# Altium footprint library MotorDriver.PcbLib: 29 footprints (part 1 of 2)
Each footprint in its own frame and in the unit in brackets; x right, y up, seen from the top. Pads: shape width x height; smd on the part's side, far side on the other; paste and mask are expansions set on the pad; w line width, h text height; cw(c..) or ccw(c..) is an arc to the next point about the centre after c.
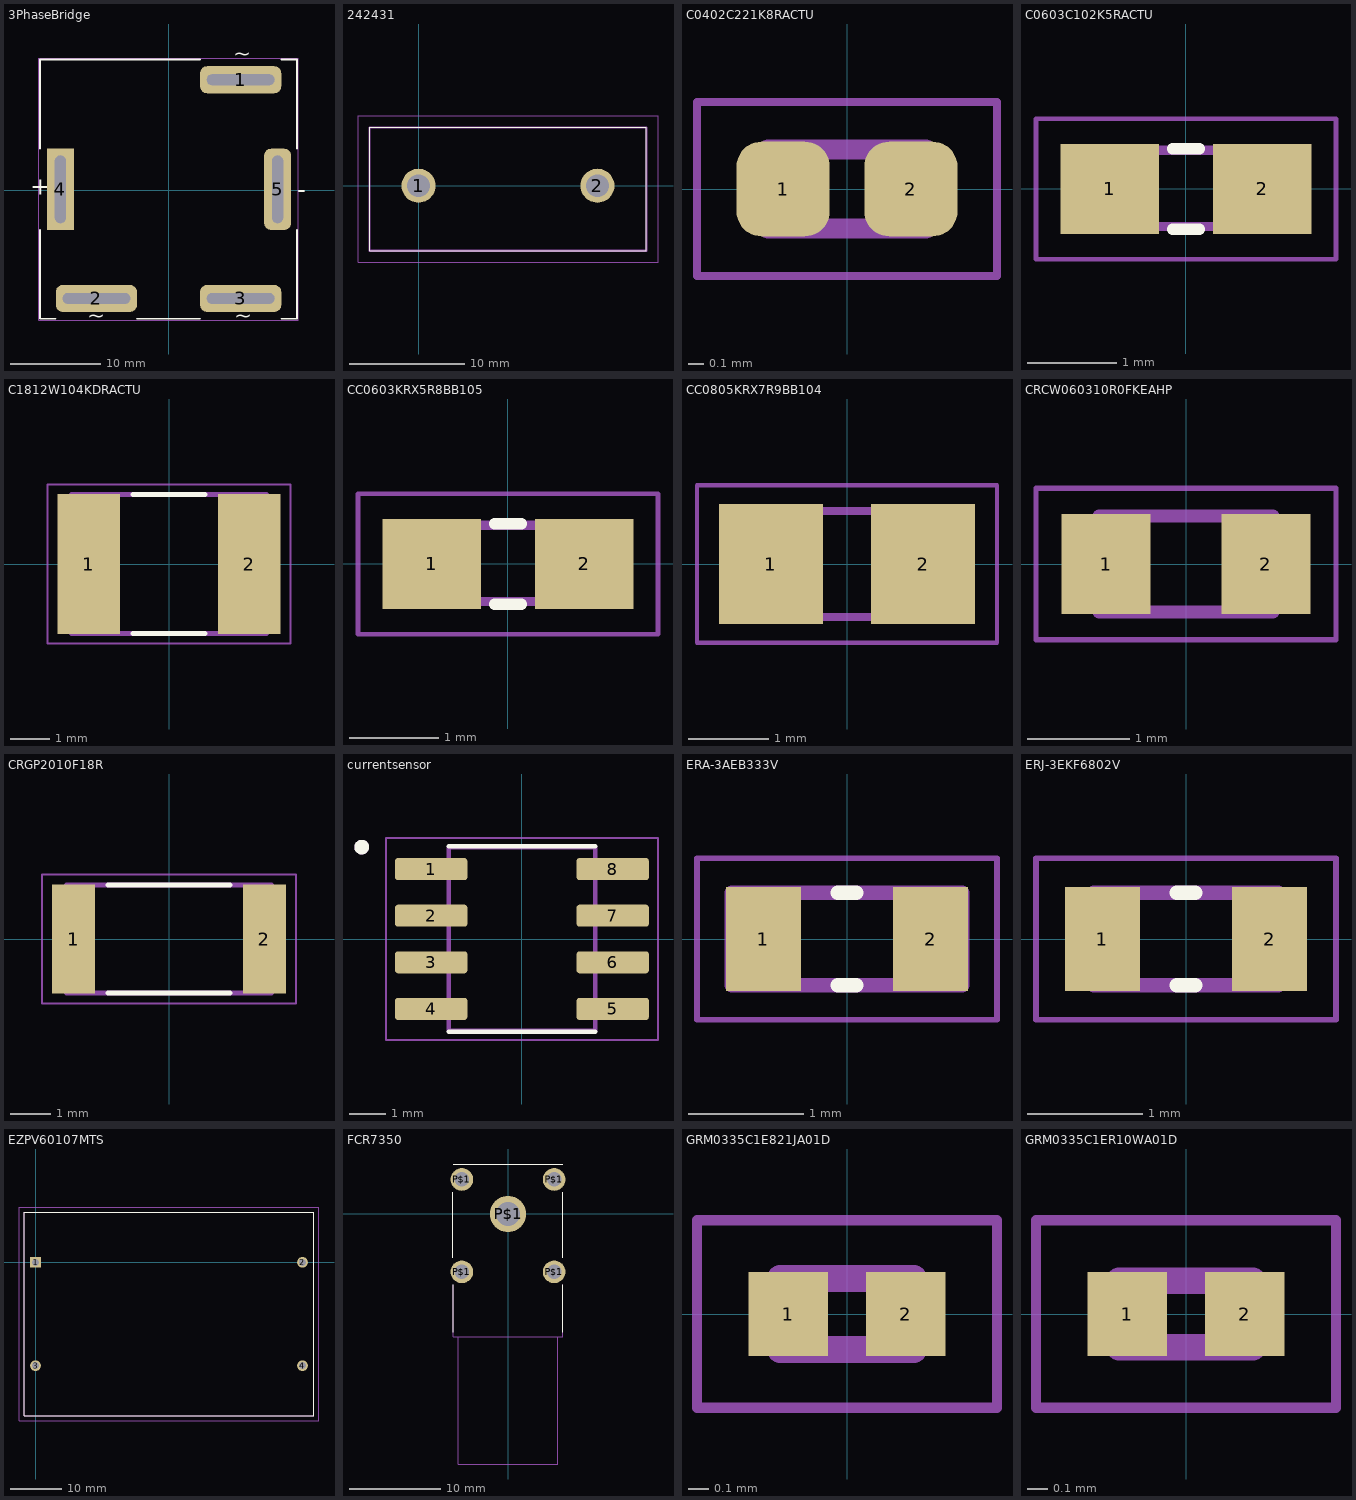
[diagram p0: the footprints below, top view; thin cyan lines are the x and y axes]

## 3PhaseBridge [mm]
pads (5):
  rrect50% 9x3 hole 1.2 slot 7.5 at 0 deg: 1(8,12.25) 2(-8,-12) 3(8,-12)
  rect 3x9 hole 7.5 slot 1.2 at 0 deg: 4(-12,0.1)
  rrect50% 3x9 hole 7.5 slot 1.2 at 0 deg: 5(12.1,0.1)
Top Overlay:
  lines w0.2: -14.25,-4.4 -14.25,-14.25 -12.5,-14.25 ; -14.25,4.6 -14.25,14.5 3.5,14.5 ; -3.5,-14.25 3.498,-14.25 ; 12.5,-14.25 14.25,-14.25 14.25,-4.4 ; 12.5,14.5 14.25,14.5 14.25,4.6
  text "+" at -15.346,-0.479 h2
  text "-" at 14.254,-0.846 h2
  text "~" at -9,-15.333 h3
  text "~" at 7.3,-15.333 h3
  text "~" at 7.2,13.767 h3
Mechanical 15:
  lines w0.1: -14.377,-14.402 14.377,-14.402 14.377,14.652 -14.377,14.652 -14.377,-14.402
3D body "p15.1_DB.stp": height 13.5, standoff -8.1, extent -14.2,-14.1 14.3,14.4

## 242431 [mm]
pads (2):
  round 2.955 hole 1.97: 1(0,0) 2(15.5,0)
Top Overlay:
  lines w0.1: -4.25,-5.65 19.75,-5.65 19.75,5.08 -4.25,5.08 -4.25,-5.65
Mechanical 13:
  lines w0.1: -5.25,-6.65 20.75,-6.65 20.75,6.08 -5.25,6.08 -5.25,-6.65
  lines w0.2: -4.25,-5.65 19.75,-5.65 19.75,5.05 -4.25,5.05 -4.25,-5.65
3D body "step_temp.STEP": height 13, standoff -6, extent -4.253,-5.685 19.747,5.015

## C0402C221K8RACTU [mm]
height 0.55
pads (2):
  rrect53% 0.59x0.6 smd: 1(-0.405,0) 2(0.405,0)
Mechanical 13:
  lines w0.127: -0.5,-0.25 0.5,-0.25 0.5,0.25 -0.5,0.25 -0.5,-0.25
Mechanical 15:
  lines w0.05: -0.95,-0.55 0.95,-0.55 0.95,0.55 -0.95,0.55 -0.95,-0.55
3D body "C0402C221K8RACTU.STEP": height 0.55, standoff 0, extent -0.489,-0.256 0.511,0.244

## C0603C102K5RACTU [mm]
pads (2):
  rect 1.1x1 smd: 1(-0.85,0) 2(0.85,0)
Top Overlay:
  lines w0.127: -0.15,-0.45 0.15,-0.45 ; -0.15,0.45 0.15,0.45
Mechanical 13:
  region: 0.83,-0.471 0.331,-0.471 0.331,0.48 0.83,0.48
  region: -0.338,-0.47 -0.839,-0.47 -0.839,0.48 -0.338,0.48
  lines w0.102: -0.356,-0.419 0.356,-0.419 ; -0.356,0.432 0.356,0.432
Mechanical 15:
  lines w0.051: -1.673,-0.783 -1.673,0.783 1.673,0.783 1.673,-0.783 -1.673,-0.783
3D body "C0603C102K5RACTU.STEP": height 0.87, standoff 0, extent -0.8,-0.4 0.8,0.4

## C1812W104KDRACTU [mm]
pads (2):
  rect 1.57x3.51 smd: 1(-2.017,0) 2(2.017,0)
Top Overlay:
  lines w0.127: -0.91,-1.75 0.91,-1.75 ; -0.91,1.75 0.91,1.75
Mechanical 13:
  lines w0.127: -2.45,-1.75 -2.45,1.75 2.45,1.75 2.45,-1.75 -2.45,-1.75
Mechanical 15:
  lines w0.05: -3.054,-2.005 -3.054,2.005 3.054,2.005 3.054,-2.005 -3.054,-2.005
3D body "C1812W104KDRACTU.STEP": height 1.85, standoff 0, extent -2.25,-1.6 2.25,1.6

## CC0603KRX5R8BB105 [mm]
pads (2):
  rect 1.1x1 smd: 1(-0.85,0) 2(0.85,0)
Top Overlay:
  lines w0.127: -0.15,-0.45 0.15,-0.45 ; -0.15,0.45 0.15,0.45
Mechanical 13:
  region: -0.338,-0.47 -0.839,-0.47 -0.839,0.48 -0.338,0.48
  region: 0.83,-0.471 0.331,-0.471 0.331,0.48 0.83,0.48
  lines w0.102: -0.356,-0.419 0.356,-0.419 ; -0.356,0.432 0.356,0.432
Mechanical 15:
  lines w0.051: -1.673,-0.783 1.673,-0.783 1.673,0.783 -1.673,0.783 -1.673,-0.783
3D body "CC0603KRX5R8BB105.STEP": height 0.9, standoff 0, extent -0.806,-0.399 0.794,0.401

## CC0805KRX7R9BB104 [mm]
pads (2):
  rect 1.3x1.5 smd: 1(-0.95,0) 2(0.95,0)
Mechanical 13:
  region: 1.106,-0.725 0.356,-0.725 0.356,0.726 1.106,0.726
  region: -0.342,-0.724 -1.093,-0.724 -1.093,0.726 -0.342,0.726
  lines w0.102: -0.381,0.66 0.381,0.66 ; -0.356,-0.66 0.381,-0.66
Mechanical 15:
  lines w0.051: -1.873,-0.983 -1.873,0.983 1.873,0.983 1.873,-0.983 -1.873,-0.983
3D body "CC0805KRX7R9BB104.STEP": height 0.7, standoff 0, extent -1,-0.625 1,0.625

## CRCW060310R0FKEAHP [mm]
pads (2):
  rect 0.87x0.98 smd: 1(-0.78,0) 2(0.78,0)
Mechanical 13:
  lines w0.127: -0.85,-0.47 -0.85,0.47 0.85,0.47 0.85,-0.47 -0.85,-0.47
Mechanical 15:
  lines w0.05: -1.465,-0.74 -1.465,0.74 1.465,0.74 1.465,-0.74 -1.465,-0.74
3D body "CRCW060310R0FKEAHP.STEP": height 0.55, standoff 0, extent -0.8,-0.425 0.8,0.425

## CRGP2010F18R [mm]
pads (2):
  rect 1.07x2.72 smd: 1(-2.38,0) 2(2.38,0)
Top Overlay:
  lines w0.127: -1.52,-1.35 1.52,-1.35 ; -1.52,1.35 1.52,1.35
Mechanical 13:
  lines w0.127: -2.55,-1.35 2.55,-1.35 2.55,1.35 -2.55,1.35 -2.55,-1.35
Mechanical 15:
  lines w0.05: -3.165,-1.608 3.165,-1.608 3.165,1.608 -3.165,1.608 -3.165,-1.608
3D body "CRGP2010F18R.STEP": height 0.65, standoff 0, extent -2.5,-1.25 2.5,1.25

## currentsensor [mm]
pads (8):
  rrect25% 1.97x0.6 smd: 1(-2.475,1.905) 2(-2.475,0.635) 3(-2.475,-0.635) 4(-2.475,-1.905) 5(2.475,-1.905) 6(2.475,-0.635) 7(2.475,0.635) 8(2.475,1.905)
Top Overlay:
  circle w0.2: c-4.37,2.505 r0.1
  lines w0.127: -2,-2.525 2,-2.525 ; -2,2.525 2,2.525
Mechanical 13:
  circle w0.2: c-4.37,2.505 r0.1
  lines w0.127: -2,-2.5 2,-2.5 2,2.5 -2,2.5 -2,-2.5
Mechanical 15:
  lines w0.05: -3.71,-2.75 3.71,-2.75 3.71,2.75 -3.71,2.75 -3.71,-2.75
3D body "step_temp.STEP": height 1.75, standoff 0, extent -3,-2.45 3,2.45

## ERA-3AEB333V [mm]
pads (2):
  rect 0.65x0.9 smd: 1(-0.725,0) 2(0.725,0)
Top Overlay:
  lines w0.127: -0.08,-0.4 0.08,-0.4 ; -0.08,0.4 0.08,0.4
Mechanical 13:
  lines w0.127: -1,-0.4 -1,0.4 1,0.4 1,-0.4 -1,-0.4
Mechanical 15:
  lines w0.05: -1.3,-0.7 -1.3,0.7 1.3,0.7 1.3,-0.7 -1.3,-0.7
3D body "ERA3AEB333V.STEP": height 0.45, standoff 0, extent -0.8,-0.4 0.8,0.4

## ERJ-3EKF6802V [mm]
pads (2):
  rect 0.65x0.9 smd: 1(-0.725,0) 2(0.725,0)
Top Overlay:
  lines w0.127: -0.08,-0.4 0.08,-0.4 ; -0.08,0.4 0.08,0.4
Mechanical 13:
  lines w0.127: -0.8,-0.4 -0.8,0.4 0.8,0.4 0.8,-0.4 -0.8,-0.4
Mechanical 15:
  lines w0.05: -1.3,-0.7 -1.3,0.7 1.3,0.7 1.3,-0.7 -1.3,-0.7
3D body "ERJ3EKF6802V.STEP": height 0.45, standoff 0, extent -0.8,-0.4 0.8,0.4

## EZPV60107MTS [mm]
pads (4):
  rect 2.1x2.1 hole 1.4: 1(0,0)
  round 2.1 hole 1.4: 2(52.5,0) 3(0,-20.3) 4(52.5,-20.3)
Top Overlay:
  lines w0.2: -2.25,-30.15 54.75,-30.15 54.75,9.85 -2.25,9.85 -2.25,-30.15
Mechanical 13:
  lines w0.1: -2.25,-30.15 54.75,-30.15 54.75,9.85 -2.25,9.85 -2.25,-30.15
Mechanical 15:
  lines w0.1: -3.25,-31.15 55.75,-31.15 55.75,10.85 -3.25,10.85 -3.25,-31.15
3D body "EZP-V60107MTS.stp": height 52.6, standoff -5, extent -2.25,-30.15 54.75,9.85

## FCR7350 [mm]
pads (5):
  round 2.5 hole 1.6: P$1(-5.08,-6.36) P$1(-5.08,3.8) P$1(5.08,-6.36) P$1(5.08,3.8)
  round 4 hole 2.6: P$1(0,0)
Top Overlay:
  lines w0.127: -6.1,-4.8 -6.1,2.4 ; -6,-13 -6,-7.8 ; -6,5.5 6,5.5 ; 6,-13 6,-7.8 ; 6,-4.8 6,2.4
Mechanical 13:
  lines w0.127: -6,-7.8 -6,-13.5 -5.5,-13.5 ; 6,-7.8 6,-13.5 5.5,-13.5 ; -5.5,-13.5 -5.5,-27.5 5.5,-27.5 5.5,-13.5 ; -5.5,-13.5 5.5,-13.5
3D body "step_temp.STEP": height 11.5, standoff -3.4, extent -5.904,-27.549 6.096,5.451

## GRM0335C1E821JA01D [mm]
pads (2):
  rect 0.38x0.4 smd: 1(-0.281,0) 2(0.281,0)
Mechanical 13:
  lines w0.127: -0.32,-0.17 -0.32,0.17 0.32,0.17 0.32,-0.17 -0.32,-0.17
Mechanical 15:
  lines w0.05: -0.718,-0.448 -0.718,0.448 0.718,0.448 0.718,-0.448 -0.718,-0.448
3D body "GRM0335C1E821JA01D.STEP": height 0.33, standoff 0, extent -0.298,-0.149 0.302,0.151

## GRM0335C1ER10WA01D [mm]
pads (2):
  rect 0.38x0.4 smd: 1(-0.281,0) 2(0.281,0)
Mechanical 13:
  lines w0.127: -0.32,-0.16 0.32,-0.16 0.32,0.16 -0.32,0.16 -0.32,-0.16
Mechanical 15:
  lines w0.05: -0.718,-0.448 0.718,-0.448 0.718,0.448 -0.718,0.448 -0.718,-0.448
3D body "GRM0335C1ER10WA01D.STEP": height 0.33, standoff 0, extent -0.3,-0.15 0.3,0.15